# Altium integrated library Integrated_jp.IntLib: 316 symbols (part 1 of 3) (continued)
## Cap_polar 1000uF/16v (continued)
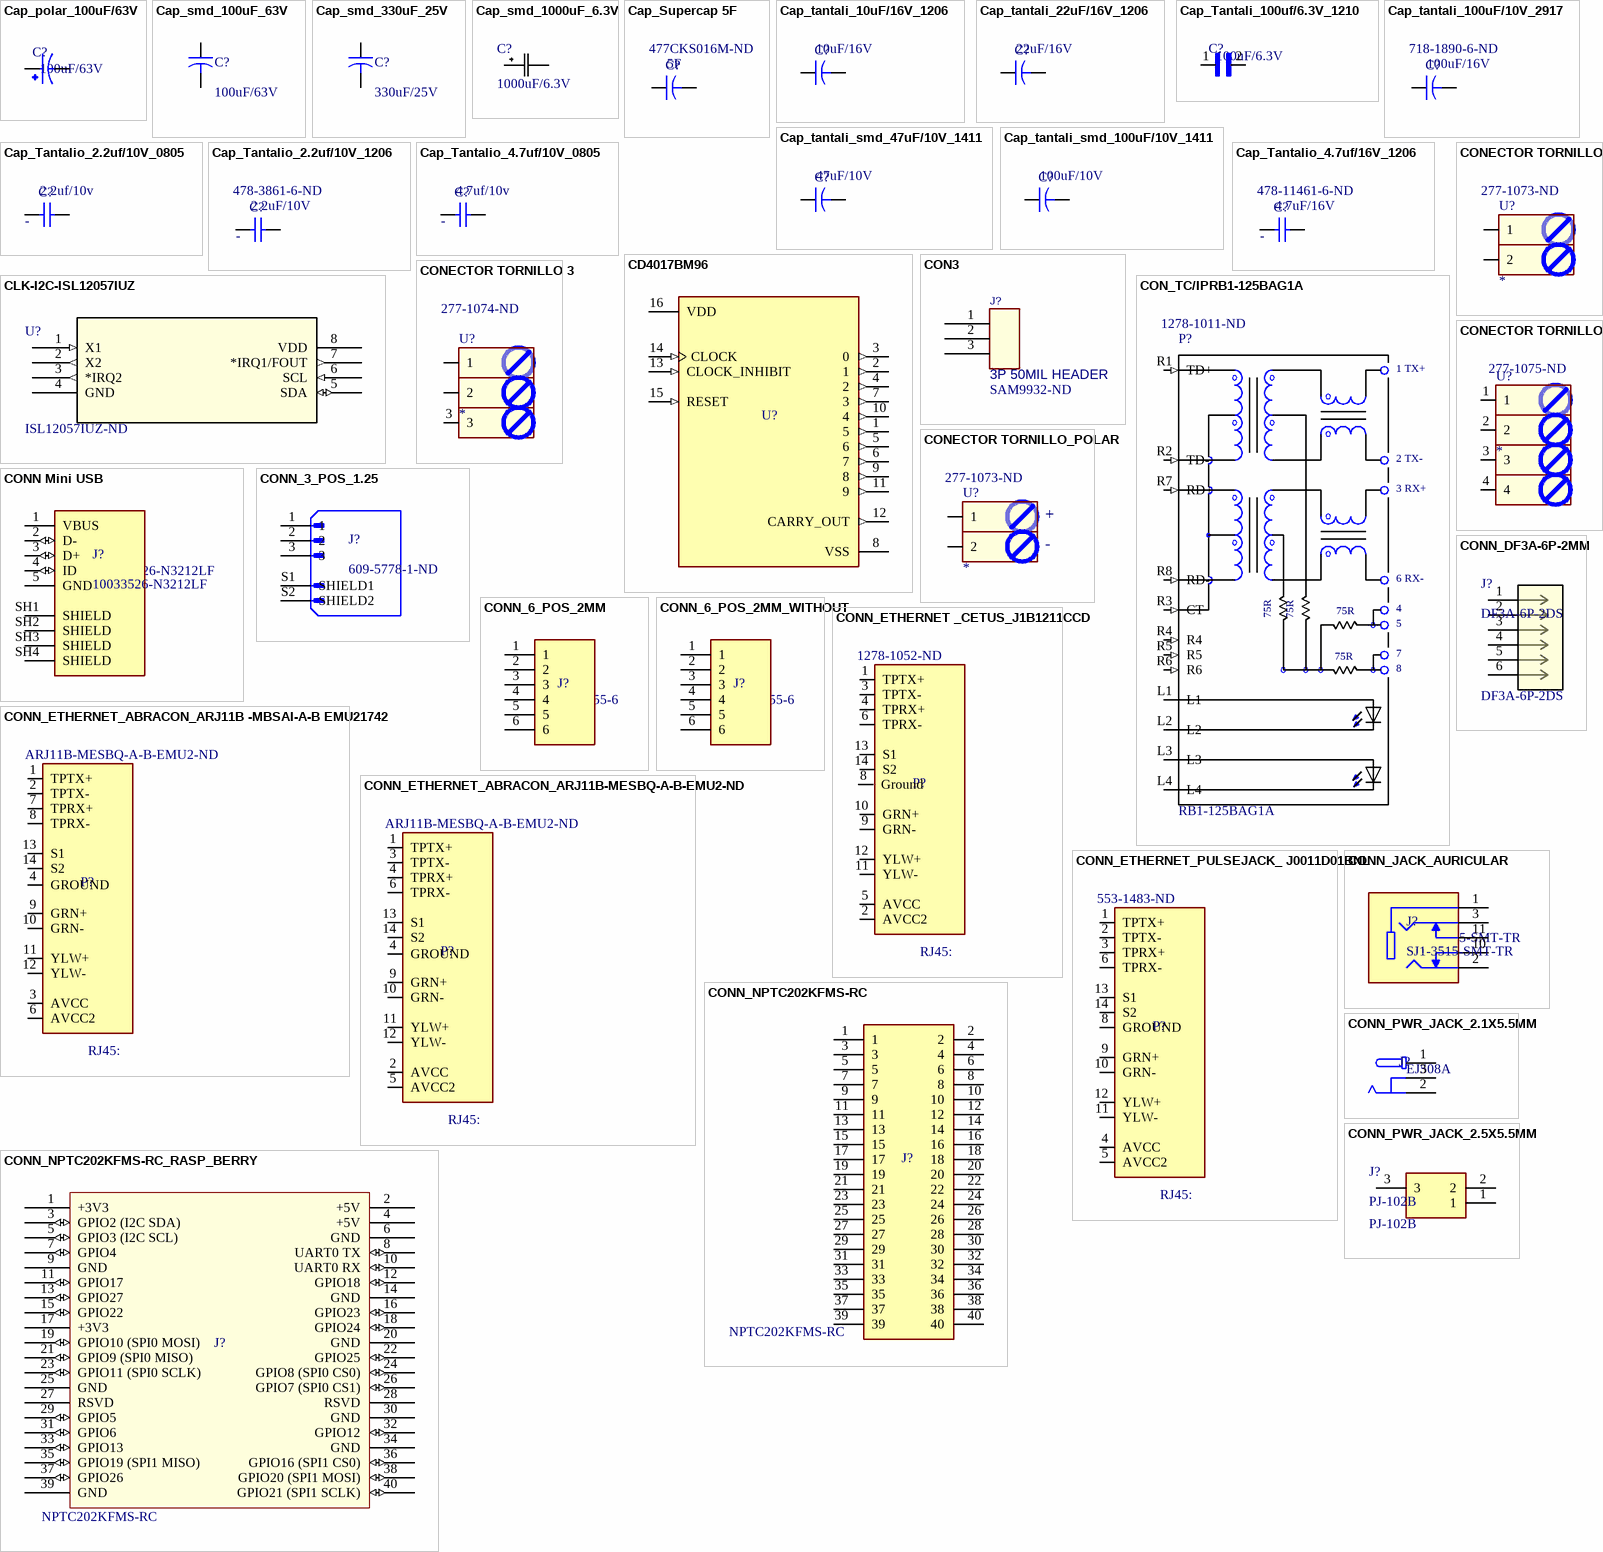
[diagram p1: symbols Cap_polar_100uF/63V to CONN_PWR_JACK_2.5X5.5MM]

## Cap_polar_100uF/63V
designator C?, comment value 100uF/63V  (hidden comment: EEU-FC1J101)
Capacitores electrolíticos de aluminio 100 µF 63 V Radial, encapsulado 3000 h a 105°C; Digi_Key_Part_Number: P10343-ND; Price: 0,65; ComponentLink1Description: CAP ALUM 100UF 20% 63V RADIAL TH; ComponentLink1URL: https://www.digikey.com/es/products/detail/panasonic-electronic-components/EEU-FC1J101/266352; Link: https://www.digikey.com/es/products/detail/panasonic-electronic-components/EEU-FC1J101/266352; LCSC Part: C2772; Mouser Part: 667-EEU-FC1J101; Price JLCPCB: 0,05
footprint CAPPRD500W60D1000H1250
pins: N, P

## Cap_smd_100uF_63V
designator C?, comment value 100uF/63V  (hidden comment: A782MS107M1JLAS030)
100 µF 63 V Aluminum - Polymer Capacitors Radial, Can - SMD 30mOhm 4000 Hrs @ 135°C; Digi_Key_Part_Number: 399-A782MS107M1JLAS030CT-ND; Link: https://www.digikey.com/en/products/detail/kemet/A782MS107M1JLAS030/21544807; Price: 1,07; JLCPCB Part: C6486600; ComponentLink1Description: CAP ALUMHYB 100UF 20% 63V SMD; ComponentLink1URL: https://www.digikey.com/en/products/detail/kemet/A782MS107M1JLAS030/21544807
footprint CAPAE1030X1030N
pins: 1, 2

## Cap_smd_330uF_25V
designator C?, comment value 330uF/25V  (hidden comment: PCE4931CT-ND)
330 µF 25 V Aluminum Electrolytic Capacitors Radial, Can - SMD 3000 Hrs @ 125°C; ComponentLink1Description: EEE-TP1E331AP; ComponentLink1URL: https://www.digikey.com/en/products/detail/panasonic-electronic-components/EEE-TP1E331AP/1975655; Digi_Key_Part_Number: PCE4931CT-ND; Link: https://www.digikey.com/en/products/detail/panasonic-electronic-components/EEE-TP1E331AP/1975655; Price: 1,57; JLCPCB Part: C2162880
footprint CAPAE1030X1030N
pins: 1, 2

## Cap_smd_1000uF_6.3V
designator C?, comment value 1000uF/6.3V  (hidden comment: RHS0J102MCN1GS)
1000 µF 6.3 V Aluminum - Polymer Capacitors Radial, Can - SMD 10mOhm 2000 Hrs @ 105°C; Digi_Key_Part_Number: 493-3774-1-ND; ComponentLink1Description: CAP ALUM POLY 1000UF 20% 6.3V; ComponentLink1URL: https://www.digikey.com/en/products/detail/nichicon/RHS0J102MCN1GS/2209464; Link: https://www.digikey.com/en/products/detail/nichicon/RHS0J102MCN1GS/2209464; Price: 1,28; JLCPCB Part: C3275499
footprint CAP_RHAHS_8X11P7_NCH
pins: 1, 2

## Cap_Supercap 5F
designator C?, comment value 5F  Supplier Part Number 1: 477CKS016M-ND  (hidden comment: 478-SCCR25B505PRB-ND)
5 F (EDLC) Supercapacitor 2.7 V Radial, Can 85mOhm @ 1kHz 2000 Hrs @ 65°C; Manufacturer: KYOCERA AVX; Dielectric Material: Aluminium; Capacitance: 5 F; Tolerance: 20%; Voltage Rating (DC): 2.7V; Life (Hours): 2000Hour; Ripple Current: 960mA; Leakage Current: 750uA; Dissipation Factor: 0.16%; Lead Diameter: 0.6mm; Published: 23-Sep-2002; PackageReference: CAPR5-4X5; Publisher: Altium Limited; PackageDescription: Capacitor; 2 Leads; Manufacturer Part Number: SCCR25B505PRB; Mount: Through Hole,PCB; Case/Package: Radial; Number of Pins: 2; Min Operating Temperature: -40°C; Max Operating Temperature: 85°C; Packaging: Tape and Reel; Voltage Rating: 2.7V; Package Quantity: 500; Termination: Radial; Voltage: 2.7V; Diameter: 10mm; Length: 20mm; Height: 20mm; Lead Pitch: 5mm; Height - Seated (Max): 0.866inch; Radiation Hardening: No; REACH SVHC: No SVHC; Lead Free: Lead Free; Supplier 1: Digi-Key; ComponentLink1Description: SUPERCAP CYLINDRICAL; ComponentLink1URL: https://www.digikey.com/en/products/detail/kyocera-avx/SCCR25B505PRB/12663768; Digi_Key_Part_Number: 478-SCCR25B505PRB-ND; Link: https://www.digikey.com/en/products/detail/kyocera-avx/SCCR25B505PRB/12663768; Price: 1,42
footprint C470U
pins: 1, 2

## Cap_tantali_10uF/16V_1206
designator C?, comment value 10uF/16V  (hidden comment: 718-1956-1-ND)
10 µF Molded Tantalum Capacitors 16 V 1206 (3216 Metric) 3Ohm; ComponentLink1Description: 293D106X0016A2TE3; ComponentLink1URL: https://www.digikey.com/es/products/detail/vishay-sprague/293D106X0016A2TE3/1578608; Digi_Key_Part_Number: 718-1956-1-ND; Link: https://www.digikey.com/es/products/detail/vishay-sprague/293D106X0016A2TE3/1578608; Price: 0,36; LCSC Part: C2162859; Mouser Part: 74-293D106X0016A2TE3; Price JLCPCB: 0,16
footprint CAP-A Size (Tantal CAP A Size EIA/IECQ 3216)
pins: 1 +, 2

## Cap_tantali_22uF/16V_1206
designator C?, comment value 22uF/16V  (hidden comment: TAJA226M016RNJ)
Capacitores de tantalio Moldeado 22 µF 16 V 1206 (3216 métrico) 2.3Ohm a 100kHz; Digi_Key_Part_Number: 478-13513-1-ND; Link: https://www.digikey.com/es/products/detail/kyocera-avx/TAJA226M016RNJ/10381501; ComponentLink1Description: CAP TANT 22UF 20% 16V 1206; ComponentLink1URL: https://www.digikey.com/es/products/detail/kyocera-avx/TAJA226M016RNJ/10381501; Price: 0,63; LCSC Part: C6328904; Mouser Part: *; Price JLCPCB: 0,34
footprint CAP-A Size (Tantal CAP A Size EIA/IECQ 3216)
pins: 1 +, 2

## Cap_Tantali_100uf/6.3V_1210
designator C?, comment value 100uF/6.3V  (hidden comment: TAJB107M006RNJ)
100 µF Molded Tantalum Capacitors 6.3 V 1411 (3528 Metric), 1210 1.7Ohm; Digi_Key_Part_Number: 478-3877-1-ND; Link: https://www.digikey.com/en/products/detail/kyocera-avx/TAJB107M006RNJ/1126805; Price: 0,56; ComponentLink1Description: CAP TANT 100UF 20% 6.3V 1411; ComponentLink1URL: https://www.digikey.com/en/products/detail/kyocera-avx/TAJB107M006RNJ/1126805
footprint CAPPC3528X210N
pins: 1 +, 2 -

## Cap_tantali_100uF/10V_2917
designator C?, comment value 100uF/16V  Supplier Part Number 1: 718-1890-6-ND  (hidden comment: 718-1890-1-ND)
Capacitores de tantalio Moldeado 100 µF 10 V 2917 (7343 métrico) 600mOhm; Manufacturer: Nichicon; Manufacturer Part Number: UVR1E102MPD1TD; Dielectric Material: Aluminium; Capacitance: 1mF; Tolerance: 20%; Voltage Rating (DC): 25V; Life (Hours): 2000Hour; Ripple Current: 960mA; Leakage Current: 750uA; Dissipation Factor: 0.16%; Lead Diameter: 0.6mm; Published: 23-Sep-2002; PackageReference: CAPR5-4X5; Publisher: Altium Limited; PackageDescription: Capacitor; 2 Leads; Mount: Through Hole,PCB; Case/Package: Radial; Number of Pins: 2; Min Operating Temperature: -40°C; Max Operating Temperature: 85°C; Packaging: Tape and Reel; Voltage Rating: 25V; Package Quantity: 500; Termination: Radial; Voltage: 25V; Diameter: 10mm; Length: 20mm; Height: 20mm; Lead Pitch: 5mm; Height - Seated (Max): 0.866inch; Radiation Hardening: No; REACH SVHC: No SVHC; Lead Free: Lead Free; Supplier 1: Digi-Key; Digi_Key_Part_Number: 718-1890-1-ND; Link: https://www.digikey.com/es/products/detail/293D107X5010D2TE3/718-1890-6-ND/3542941?utm_campaign=buynow&utm_medium=aggregator&curr=usd&utm_source=octopart; ComponentLink1Description: CAP TANT 100UF 5% 10V 2917; ComponentLink1URL: https://www.digikey.com/es/products/detail/293D107X5010D2TE3/718-1890-6-ND/3542941?utm_campaign=buynow&utm_medium=aggregator&curr=usd&utm_source=octopart; Price: 1,39
footprint CAP_2917
pins: 1 +, 2

## Cap_tantali_smd_47uF/10V_1411
designator C?, comment value 47uF/10V  (hidden comment: 399-9728-1-ND)
47 µF Molded Tantalum Capacitors 10 V 1411 (3528 Metric) 1Ohm; ComponentLink1Description: T491B476K010AT; ComponentLink1URL: https://www.digikey.com/es/products/detail/kemet/T491B476K010AT/3724805?s=N4IgTCBcDaIMwE4EFoEHYwA5kEZkDkAREAXQF8g; Link: https://www.digikey.com/es/products/detail/kemet/T491B476K010AT/3724805?s=N4IgTCBcDaIMwE4EFoEHYwA5kEZkDkAREAXQF8g; Price: 0,63; Digi_Key_Part_Number: 399-9728-1-ND; LCSC Part: C116617; Mouser Part: 80-T491B476K010; Price JLCPCB: 0,16
footprint CAPPC3528X210N
pins: 1, 2

## Cap_tantali_smd_100uF/10V_1411
designator C?, comment value 100uF/10V  (hidden comment: F931A107KBA)
Capacitores de tantalio Moldeado 100 µF 10 V 1411 (3528 métrico), 1210 1.2Ohm a 100kHz; Digi_Key_Part_Number: 478-8195-1-ND; Link: https://www.digikey.com/es/products/detail/kyocera-avx/F931A107KBA/4005266; Price: 0,77; LCSC Part: C7196; Mouser Part: 647-F931A107KBA; Price JLCPCB: 0,24; ComponentLink1Description: CAP TANT 100UF 10% 10V 1411; ComponentLink1URL: https://www.digikey.com/es/products/detail/kyocera-avx/F931A107KBA/4005266
footprint CAPPC3528X210N
pins: 1, 2

## Cap_Tantalio_2.2uf/10V_0805
designator C?, comment value 2.2uf/10v  (hidden comment: 718-2352-1-ND)
Capacitores de tantalCapacitores de tantalio Moldeado 2.2 µF 10 V 0805 (2012 métrico) 8.8Ohm a 100kHzio Moldeado 10µF 16V 0805; ComponentLink1Description: CAP TANT 2.2UF 20% 10V 0805; ComponentLink1URL: https://www.digikey.com/es/products/detail/TMCHP1A225MTRF/718-2352-6-ND/10107774?utm_campaign=buynow&utm_medium=aggregator&curr=usd&utm_source=octopart; Digi_Key_Part_Number: 718-2352-1-ND; Link: https://www.digikey.com/es/products/detail/TMCHP1A225MTRF/718-2352-6-ND/10107774?utm_campaign=buynow&utm_medium=aggregator&curr=usd&utm_source=octopart; Price: 0,26; LCSC Part: C5137599; Mouser Part: TMCHP1A225MTRF; Price JLCPCB: 0,02
footprint CAP_tantalio_0805
pins: 1 -, 2

## Cap_Tantalio_2.2uf/10V_1206
designator C?, comment value 2.2uF/10V  Supplier Part Number 1: 478-3861-6-ND  (hidden comment: 478-3861-1-ND)
2.2 µF Molded Tantalum Capacitors 10 V 1206 (3216 Metric) 7Ohm @ 100kHz; Manufacturer: Kyocera AVX; Manufacturer Part Number: 08055C104MAT2A; Dielectric Material: Ceramic; Capacitance: 100nF; Voltage Rating: 50V; Tolerance: 20%; Dielectric: X7R; Dissipation Factor: 2.5%; Insulation Resistance: 100GR; ESR (Equivalent Series Resistance): 3R; Life (Hours): 2000Hour; Published: 8-Jun-2000; LatestRevisionDate: 17-Jul-2002; LatestRevisionNote: Re-released for DXP Platform.; PackageReference: RAD-0.3; Publisher: Altium Limited; PackageDescription: Radial Cap, Thru-Hole; 2 Leads; 0.3 in Pin Spacing; Mount: Surface Mount,PCB; Case/Package: 0805; Number of Pins: 2; Case Code (Metric): 2012; Case Code (Imperial): 0805; Contact Plating: Tin,Matte; Min Operating Temperature: -55°C; Max Operating Temperature: 125°C; Package Quantity: 1; Packaging: Tape and Reel; Voltage Rating (DC): 50V; Termination: SMD/SMT; Voltage: 50V; Length: 2.01mm; Height: 0.94mm; Width: 0.049inch; Thickness: 0.037inch; Depth: 1.25mm; Radiation Hardening: No; REACH SVHC: No SVHC; Lead Free: Lead Free; Features: General Purpose; Supplier 1: Digi-Key; Link: https://www.digikey.com/es/products/detail/TAJA225K010RNJ/478-3861-6-ND/1127025?utm_campaign=buynow&utm_medium=aggregator&curr=usd&utm_source=octopart; Digi_Key_Part_Number: 478-3861-1-ND; ComponentLink1Description: CAP TANT 2.2UF 10% 10V 1206; ComponentLink1URL: https://www.digikey.com/es/products/detail/kyocera-avx/TAJA225K010RNJ/1126789?s=N4IgTCBcDaICwHYAcBaAzEgbARhbgcgCIgC6AvkA; Price: 0,38
footprint CAP_tantalio_1206
pins: 1 -, 2

## Cap_Tantalio_4.7uf/10V_0805
designator C?, comment value 4.7uf/10v  (hidden comment: F921A475MPA)
Capacitores de tantalio Moldeado 4.7 µF 10 V 0805 (2012 métrico) 6Ohm; Digi_Key_Part_Number: 478-8125-1-ND; Link: https://www.digikey.com/es/products/detail/kyocera-avx/F921A475MPA/4004984; Price: 0,36; LCSC Part: C76639; Price JLCPCB: 0,039; ComponentLink1Description: CAP TANT 4.7UF 20% 10V 0805; ComponentLink1URL: https://www.digikey.com/es/products/detail/kyocera-avx/F921A475MPA/4004984
footprint CAP_tantalio_0805
pins: 1 -, 2

## Cap_Tantalio_4.7uf/16V_1206
designator C?, comment value 4.7uF/16V  Supplier Part Number 1: 478-11461-6-ND  (hidden comment: 478-11461-1-ND)
Capacitores de tantalio Moldeado 4.7 µF 16 V 1206 (3216 métrico); Manufacturer: Kyocera AVX; Manufacturer Part Number: 08055C104MAT2A; Dielectric Material: Ceramic; Capacitance: 100nF; Voltage Rating: 50V; Tolerance: 20%; Dielectric: X7R; Dissipation Factor: 2.5%; Insulation Resistance: 100GR; ESR (Equivalent Series Resistance): 3R; Life (Hours): 2000Hour; Published: 8-Jun-2000; LatestRevisionDate: 17-Jul-2002; LatestRevisionNote: Re-released for DXP Platform.; PackageReference: RAD-0.3; Publisher: Altium Limited; PackageDescription: Radial Cap, Thru-Hole; 2 Leads; 0.3 in Pin Spacing; Mount: Surface Mount,PCB; Case/Package: 0805; Number of Pins: 2; Case Code (Metric): 2012; Case Code (Imperial): 0805; Contact Plating: Tin,Matte; Min Operating Temperature: -55°C; Max Operating Temperature: 125°C; Package Quantity: 1; Packaging: Tape and Reel; Voltage Rating (DC): 50V; Termination: SMD/SMT; Voltage: 50V; Length: 2.01mm; Height: 0.94mm; Width: 0.049inch; Thickness: 0.037inch; Depth: 1.25mm; Radiation Hardening: No; REACH SVHC: No SVHC; Lead Free: Lead Free; Features: General Purpose; Supplier 1: Digi-Key; Digi_Key_Part_Number: 478-11461-1-ND; Link: https://www.digikey.com/es/products/detail/TAJA475K016UNJ/478-11461-6-ND/8019359?utm_campaign=buynow&utm_medium=aggregator&curr=usd&utm_source=octopart; ComponentLink1Description: CAP TANT 4.7UF 10% 16V 1206; ComponentLink1URL: https://www.digikey.com/es/products/detail/TAJA475K016UNJ/478-11461-6-ND/8019359?utm_campaign=buynow&utm_medium=aggregator&curr=usd&utm_source=octopart; Price: 0,38
footprint CAP_tantalio_1206
pins: 1 -, 2

## CD4017BM96
designator U?
Counter IC Counter, Decade 1 Element 10 Bit Positive, Negative 16-SOIC; Digi_Key_Part_Number: 296-25940-1-ND; Price: 0,47; ComponentLink1Description: CD4017BM96; ComponentLink1URL: https://www.digikey.com/en/products/detail/texas-instruments/CD4017BM96/1690809; Link: https://www.digikey.com/en/products/detail/texas-instruments/CD4017BM96/1690809; Price JLCPCB: 0,41; LCSC Part: C11349; Mouser Part: *; Value: CD4017BM96
footprint SOIC127P600X175-16N
pins: 1 5 (out), 2 1 (out), 3 0 (out), 4 2 (out), 5 6 (out), 6 7 (out), 7 3 (out), 8 VSS (power), 9 8 (out), 10 4 (out), 11 9 (out), 12 CARRY_OUT (out), 13 CLOCK_INHIBIT (in), 14 CLOCK (in), 15 RESET (in), 16 VDD (power)

## CLK-I2C-ISL12057IUZ
designator U?, comment value ISL12057IUZ-ND  (hidden comment: ISL12057IUZ)
Relojes de tiempo real (RTC) IC Reloj/calendario I2C, 2-Wire serial 8-TSSOP, 8-MSOP (0.118", 3.00mm de ancho); Mfr_Name: Renesas / Intersil; RefDes: RefDes; Type: Type; ComponentLink1Description: IC RTC CLK/CALENDAR I2C 8MSOP; ComponentLink1URL: https://www.digikey.com/es/products/detail/renesas-electronics-corporation/ISL12057IUZ/2096552; Link: https://www.digikey.com/es/products/detail/renesas-electronics-corporation/ISL12057IUZ/2096552; Digi_Key_Part_Number: ISL12057IUZ-ND; Price: 2,78
footprint 8L-MSOP_REN
pins: 1 X1 (in), 2 X2 (out), 3 *IRQ2 (out), 4 GND (power), 5 SDA (io), 6 SCL (in), 7 *IRQ1/FOUT (out), 8 VDD (power)

## CON3
designator J?, comment 3P 50MIL HEADER  Supplier Part Number 1: SAM9932-ND
COMPSIDE: TOP; COMPLOC: [730.000,710.000]; COMPROT: 0; COMPFIXED: NO; COMPHEIGHT: 0.000; COMPGROUP: 0; COMPLOCKED: NO; COMPKEY: NO; DECOUPLER: NO; MEMORY: NO; Supplier 1: Digi-Key
footprint 3P 50 MIL HEADER_RDS
pins: 1, 2, 3

## CON_TC/IPRB1-125BAG1A
designator P?, comment RB1-125BAG1A  Supplier Part Number 1: 1278-1011-ND
Accessory RJ-45 With Transformer Connector - UDE; MF: WIZnet; Shielding: Shielded; Connector Type: RJ45; Number of Ports: 1; Direction: Down; Number of Positions: 8; Insulation Resistance: 500MR; Number of Cores per Jack: 4; Availability: Unavailable; Price: None; Package: HVQFN-36 NXP Semiconductors; SnapEDA_Link: https://www.snapeda.com/parts/RB1-125BAG1A/WIZnet/view-part/?ref=snap; MP: RB1-125BAG1A; Value: *; Supplier 1: Digi-Key; Manufacturer: WIZnet; Manufacturer Part Number: RB1-125BAG1A; Stock 1: 11611; Pricing 1: 1=2.55, 10=2.448, 25=2.244, 50=2.142, 100=2.04, 250=1.785, 500=1.734, 1000=1.56 (USD); Mount: Through Hole; Case/Package: 100; Color: Green,Yellow,Black; Contact Material: Bronze; Contact Plating: Gold; Housing Material: Thermoplastic; Min Operating Temperature: 0°C; Max Operating Temperature: 70°C; Number of Rows: 1; Packaging: Bulk; Package Quantity: 420; Termination: Solder; Lead Free: Lead Free; ComponentLink1URL: http://www1.futureelectronics.com/doc/WIZNET%20INC/RB1-125BAG1A.pdf?src-supplier=Future+Electronics; ComponentLink1Description: http://www1.futureelectronics.com/doc/WIZNET%20INC/RB1-125BAG1A.pdf?src-supplier=Future+Electronics; ComponentLink2URL: http://www.jameco.com/Jameco/Products/ProdDS/2132875.pdf?src-supplier=Jameco; ComponentLink2Description: http://www.jameco.com/Jameco/Products/ProdDS/2132875.pdf?src-supplier=Jameco; ComponentLink3URL: https://www.shopwiznet.com/lanotattachments/download/file/id/95/store/1/?src-supplier=Digi-Key; ComponentLink3Description: https://www.shopwiznet.com/lanotattachments/download/file/id/95/store/1/?src-supplier=Digi-Key; ComponentLink4URL: http://www.mouser.com/ds/2/443/RB1-125BAG1A(111-00)-224696.pdf?src-supplier=Mouser; ComponentLink4Description: http://www.mouser.com/ds/2/443/RB1-125BAG1A(111-00)-224696.pdf?src-supplier=Mouser
footprint J1B1211CCD
pins: L1, L2, L3, L4, R1 TD+ (in), R2 TD- (in), R3 CT (in), R4 (in), R5 (in), R6 (in), R7 RD+ (in), R8 RD- (in)
text: 1 TX+; 2 TX-; 3 RX+; 6 RX-; 75R; 5; 7

## CONECTOR TORNILLO 2
designator U?  Supplier Part Number 1: 277-1073-ND
Manufacturer: Phoenix Contact; Manufacturer Part Number: 1753437; Current Rating: 12A; Voltage Rating: 250V; Number of Positions: 2; Number of Levels: 1; Voltage: 300V; Voltage Rating (DC): 400V; Pitch: 5mm; Approvals: UL,CSA; Supplier 1: Digi-Key; Stock 1: 7580; Pricing 1: 1=0.72, 10=0.688, 50=0.6584, 100=0.6404, 250=0.59852, 500=0.55062, 1000=0.50873, 2500=0.48479, 5000=0.45486 (USD); Mount: Through Hole; Weight: 0.037778oz; Color: Grey,Green; Contact Plating: Tin; Contact Material: Copper,Tin; Housing Color: Green; Housing Material: Polybutylene; Number of Rows: 1; Package Quantity: 50; Packaging: Bulk; Termination: Solder; Number of Positions Per Level: 2; Current: 12A; Max Current Rating: 12A; Number of Contacts: 2; Orientation: Straight; Number of Poles: 2; Length: 10mm; Height: 10mm; Width: 15.9mm; Depth: 8.6mm; Lead Free: Lead Free; Flammability Rating: UL94 V-0; ComponentLink1URL: https://www.verical.com/server-webapp/html/getDatasheet?partID=294641&src-supplier=Verical; ComponentLink1Description: https://www.verical.com/server-webapp/html/getDatasheet?partID=294641&src-supplier=Verical; ComponentLink2URL: https://media.digikey.com/pdf/Data%20Sheets/Phoenix%20Contact%20PDFs/1753437.pdf?src-supplier=Digi-Key; ComponentLink2Description: https://media.digikey.com/pdf/Data%20Sheets/Phoenix%20Contact%20PDFs/1753437.pdf?src-supplier=Digi-Key; ComponentLink3URL: https://produktinfo.conrad.com/datenblaetter/725000-749999/743815-da-01-en-GRUNDGEHAEUSE__MSTBV_2_5__2_G.pdf?src-supplier=Conrad; ComponentLink3Description: https://produktinfo.conrad.com/datenblaetter/725000-749999/743815-da-01-en-GRUNDGEHAEUSE__MSTBV_2_5__2_G.pdf?src-supplier=Conrad
footprint 277-1140 (TERM BLOCK 2POS)
pins: 1, 2

## CONECTOR TORNILLO 3
designator U?  Supplier Part Number 1: 277-1074-ND
Manufacturer: Phoenix Contact; Manufacturer Part Number: 1753437; Current Rating: 12A; Voltage Rating: 250V; Number of Positions: 2; Number of Levels: 1; Voltage: 300V; Voltage Rating (DC): 400V; Pitch: 5mm; Approvals: UL,CSA; Mount: Through Hole; Weight: 0.037778oz; Color: Grey,Green; Contact Plating: Tin; Contact Material: Copper,Tin; Housing Color: Green; Housing Material: Polybutylene; Number of Rows: 1; Package Quantity: 50; Packaging: Bulk; Termination: Solder; Number of Positions Per Level: 2; Current: 12A; Max Current Rating: 12A; Number of Contacts: 2; Orientation: Straight; Number of Poles: 2; Length: 10mm; Height: 10mm; Width: 15.9mm; Depth: 8.6mm; Lead Free: Lead Free; Flammability Rating: UL94 V-0; ComponentLink1URL: https://www.verical.com/server-webapp/html/getDatasheet?partID=294641&src-supplier=Verical; ComponentLink1Description: https://www.verical.com/server-webapp/html/getDatasheet?partID=294641&src-supplier=Verical; ComponentLink2URL: https://media.digikey.com/pdf/Data%20Sheets/Phoenix%20Contact%20PDFs/1753437.pdf?src-supplier=Digi-Key; ComponentLink2Description: https://media.digikey.com/pdf/Data%20Sheets/Phoenix%20Contact%20PDFs/1753437.pdf?src-supplier=Digi-Key; ComponentLink3URL: https://produktinfo.conrad.com/datenblaetter/725000-749999/743815-da-01-en-GRUNDGEHAEUSE__MSTBV_2_5__2_G.pdf?src-supplier=Conrad; ComponentLink3Description: https://produktinfo.conrad.com/datenblaetter/725000-749999/743815-da-01-en-GRUNDGEHAEUSE__MSTBV_2_5__2_G.pdf?src-supplier=Conrad; Supplier 1: Digi-Key; Stock 1: 2384; Pricing 1: 1=1.06, 10=1.014, 50=0.9702, 100=0.9437, 250=0.882, 500=0.81144, 1000=0.7497, 2500=0.71442, 5000=0.67032 (USD); ComponentLink4URL: https://media.digikey.com/pdf/Data%20Sheets/Phoenix%20Contact%20PDFs/1753453.pdf?src-supplier=Digi-Key; ComponentLink4Description: https://media.digikey.com/pdf/Data%20Sheets/Phoenix%20Contact%20PDFs/1753453.pdf?src-supplier=Digi-Key; ComponentLink5URL: https://www.alliedelec.com/m/d/04bf1952d21caef77442e0e02da47893.pdf?src-supplier=Allied+Electronics; ComponentLink5Description: https://www.alliedelec.com/m/d/04bf1952d21caef77442e0e02da47893.pdf?src-supplier=Allied+Electronics; ComponentLink6URL: https://produktinfo.conrad.com/datenblaetter/725000-749999/743827-da-01-en-GRUNDGEHAEUSE__MSTBV_2_5__3_G.pdf?src-supplier=Conrad; ComponentLink6Description: https://produktinfo.conrad.com/datenblaetter/725000-749999/743827-da-01-en-GRUNDGEHAEUSE__MSTBV_2_5__3_G.pdf?src-supplier=Conrad
footprint 277-1141 (TERM BLOCK HDR 3POS)
pins: 1, 2, 3

## CONECTOR TORNILLO 4
designator U?  Supplier Part Number 1: 277-1075-ND
Manufacturer: Phoenix Contact; Manufacturer Part Number: 1753437; Current Rating: 12A; Voltage Rating: 250V; Number of Positions: 2; Number of Levels: 1; Voltage: 300V; Voltage Rating (DC): 400V; Pitch: 5mm; Approvals: UL,CSA; Mount: Through Hole; Weight: 0.037778oz; Color: Grey,Green; Contact Plating: Tin; Contact Material: Copper,Tin; Housing Color: Green; Housing Material: Polybutylene; Number of Rows: 1; Package Quantity: 50; Packaging: Bulk; Termination: Solder; Number of Positions Per Level: 2; Current: 12A; Max Current Rating: 12A; Number of Contacts: 2; Orientation: Straight; Number of Poles: 2; Length: 10mm; Height: 10mm; Width: 15.9mm; Depth: 8.6mm; Lead Free: Lead Free; Flammability Rating: UL94 V-0; ComponentLink1URL: https://www.verical.com/server-webapp/html/getDatasheet?partID=294641&src-supplier=Verical; ComponentLink1Description: https://www.verical.com/server-webapp/html/getDatasheet?partID=294641&src-supplier=Verical; ComponentLink2URL: https://media.digikey.com/pdf/Data%20Sheets/Phoenix%20Contact%20PDFs/1753437.pdf?src-supplier=Digi-Key; ComponentLink2Description: https://media.digikey.com/pdf/Data%20Sheets/Phoenix%20Contact%20PDFs/1753437.pdf?src-supplier=Digi-Key; ComponentLink3URL: https://produktinfo.conrad.com/datenblaetter/725000-749999/743815-da-01-en-GRUNDGEHAEUSE__MSTBV_2_5__2_G.pdf?src-supplier=Conrad; ComponentLink3Description: https://produktinfo.conrad.com/datenblaetter/725000-749999/743815-da-01-en-GRUNDGEHAEUSE__MSTBV_2_5__2_G.pdf?src-supplier=Conrad; ComponentLink4URL: https://www.verical.com/server-webapp/html/getDatasheet?partID=247903&src-supplier=Verical; ComponentLink4Description: https://www.verical.com/server-webapp/html/getDatasheet?partID=247903&src-supplier=Verical; ComponentLink5URL: https://media.digikey.com/pdf/Data%20Sheets/Phoenix%20Contact%20PDFs/1754478.pdf?src-supplier=Digi-Key; ComponentLink5Description: https://media.digikey.com/pdf/Data%20Sheets/Phoenix%20Contact%20PDFs/1754478.pdf?src-supplier=Digi-Key; ComponentLink6URL: https://produktinfo.conrad.com/datenblaetter/725000-749999/743854-da-01-en-GRUNDGEHAEUSE__MSTB_2_5__4_G.pdf?src-supplier=Conrad; ComponentLink6Description: https://produktinfo.conrad.com/datenblaetter/725000-749999/743854-da-01-en-GRUNDGEHAEUSE__MSTB_2_5__4_G.pdf?src-supplier=Conrad; Supplier 1: Digi-Key; Stock 1: 3061; Pricing 1: 1=1.45, 10=1.389, 50=1.3282, 100=1.292, 250=1.20752, 500=1.1109, 1000=1.02637, 2500=0.97807, 5000=0.9177 (USD); ComponentLink7URL: https://media.digikey.com/pdf/Data%20Sheets/Phoenix%20Contact%20PDFs/1753479.pdf?src-supplier=Digi-Key; ComponentLink7Description: https://media.digikey.com/pdf/Data%20Sheets/Phoenix%20Contact%20PDFs/1753479.pdf?src-supplier=Digi-Key; ComponentLink8URL: https://www.verical.com/server-webapp/html/getDatasheet?partID=717945&src-supplier=Verical; ComponentLink8Description: https://www.verical.com/server-webapp/html/getDatasheet?partID=717945&src-supplier=Verical; ComponentLink9URL: https://produktinfo.conrad.com/datenblaetter/725000-749999/743463-da-01-en-GRUNDGEHAEUSE___MSTBV_2_5__4_G.pdf?src-supplier=Conrad; ComponentLink9Description: https://produktinfo.conrad.com/datenblaetter/725000-749999/743463-da-01-en-GRUNDGEHAEUSE___MSTBV_2_5__4_G.pdf?src-supplier=Conrad
footprint 277-1075 (TERM BLOCK HDR 3POS)
pins: 1, 2, 3, 4

## CONECTOR TORNILLO_POLAR
designator U?  Supplier Part Number 1: 277-1073-ND
Manufacturer: Phoenix Contact; Manufacturer Part Number: 1753437; Current Rating: 12A; Voltage Rating: 250V; Number of Positions: 2; Number of Levels: 1; Voltage: 300V; Voltage Rating (DC): 400V; Pitch: 5mm; Approvals: UL,CSA; Supplier 1: Digi-Key; Stock 1: 7580; Pricing 1: 1=0.72, 10=0.688, 50=0.6584, 100=0.6404, 250=0.59852, 500=0.55062, 1000=0.50873, 2500=0.48479, 5000=0.45486 (USD); Mount: Through Hole; Weight: 0.037778oz; Color: Grey,Green; Contact Plating: Tin; Contact Material: Copper,Tin; Housing Color: Green; Housing Material: Polybutylene; Number of Rows: 1; Package Quantity: 50; Packaging: Bulk; Termination: Solder; Number of Positions Per Level: 2; Current: 12A; Max Current Rating: 12A; Number of Contacts: 2; Orientation: Straight; Number of Poles: 2; Length: 10mm; Height: 10mm; Width: 15.9mm; Depth: 8.6mm; Lead Free: Lead Free; Flammability Rating: UL94 V-0; ComponentLink1URL: https://www.verical.com/server-webapp/html/getDatasheet?partID=294641&src-supplier=Verical; ComponentLink1Description: https://www.verical.com/server-webapp/html/getDatasheet?partID=294641&src-supplier=Verical; ComponentLink2URL: https://media.digikey.com/pdf/Data%20Sheets/Phoenix%20Contact%20PDFs/1753437.pdf?src-supplier=Digi-Key; ComponentLink2Description: https://media.digikey.com/pdf/Data%20Sheets/Phoenix%20Contact%20PDFs/1753437.pdf?src-supplier=Digi-Key; ComponentLink3URL: https://produktinfo.conrad.com/datenblaetter/725000-749999/743815-da-01-en-GRUNDGEHAEUSE__MSTBV_2_5__2_G.pdf?src-supplier=Conrad; ComponentLink3Description: https://produktinfo.conrad.com/datenblaetter/725000-749999/743815-da-01-en-GRUNDGEHAEUSE__MSTBV_2_5__2_G.pdf?src-supplier=Conrad
footprint 277-1140 (TERM BLOCK 2POS)
pins: 1, 2
text: +; -

## CONN Mini USB
designator J?, comment 10033526-N3212LF
MINI USB 2.0- B Type Receptacle conn. Right Angle Surface Mount Type; Digi_Key_Part_Number: 609-4700-1-ND; SnapEDA_Link: https://www.snapeda.com/parts/10033526-N3212LF/Amphenol+FCI/view-part/?ref=snap; Price: 0,75; MP: 10033526-N3212LF; Link: https://www.digikey.com/en/products/detail/amphenol-cs-fci/10033526-N3212LF/4292074?s=N4IgTCBcDaIIwAYEGZkFYwDYC0A5ZYcYAMgGIgC6AvkA; ComponentLink1Description: CONN RCPT MINI USB B 5POS SMD RA; ComponentLink1URL: https://www.digikey.com/en/products/detail/amphenol-cs-fci/10033526-N3212LF/4292074?s=N4IgTCBcDaIIwAYEGZkFYwDYC0A5ZYcYAMgGIgC6AvkA; Value: 10033526-N3212LF
footprint AMPHENOL_10033526-N3212LF
pins: 1 VBUS (power), 2 D- (io), 3 D+ (io), 4 ID (io), 5 GND (power), SH1 SHIELD, SH2 SHIELD, SH3 SHIELD, SH4 SHIELD

## CONN_3_POS_1.25
designator J?, comment 609-5778-1-ND
Cabezal de conector Montaje en superficie, ángulo recto 3 posiciones 0.049" (1.25mm); MF: Molex; MP: 532610371; Check_prices: https://www.snapeda.com/parts/532610371/Molex/view-part/?ref=eda; Value: *; Price: None; Package: None; Availability: In Stock; Purchase-URL: https://pricing.snapeda.com/search/part/532610371/?ref=eda; SnapEDA_Link: https://www.snapeda.com/parts/532610371/Molex/view-part/?ref=snap; ComponentLink1Description: CONN HEADER SMD R/A 3POS 1.25MM; ComponentLink1URL: https://www.digikey.com/es/products/detail/amphenol-cs-fci/10114830-10103LF/4238857; Link: https://www.digikey.com/es/products/detail/amphenol-cs-fci/10114830-10103LF/4238857; Digi_Key_Part_Number: 609-5778-1-ND
footprint MOLEX_532610371
pins: 1, 2, 3, S1 SHIELD1, S2 SHIELD2

## CONN_6_POS_2MM
designator J?, comment 440055-6
Cabezal de conector Orificio pasante, ángulo recto 6 posiciones 0.079" (2.00mm); Digi_Key_Part_Number: A100047-ND; MF: {'manufacturer': 'TE Connectivity'}; Package: None; Availability: Unavailable; MP: 440055-6; Price: 0,29; ComponentLink1Description: CONN HEADER R/A 6POS 2MM; ComponentLink1URL: https://www.digikey.com/es/products/detail/te-connectivity-amp-connectors/440055-6/2077950; Link: https://www.digikey.com/es/products/detail/te-connectivity-amp-connectors/440055-6/2077950; Value: 440055-6
footprint TE_440055-6
pins: 1, 2, 3, 4, 5, 6

## CONN_6_POS_2MM_WITHOUT
designator J?, comment 440055-6
Cabezal de conector Orificio pasante, ángulo recto 6 posiciones 0.079" (2.00mm); Digi_Key_Part_Number: A100047-ND; MF: {'manufacturer': 'TE Connectivity'}; Package: None; Availability: Unavailable; MP: 440055-6; Price: 0,29; ComponentLink1Description: CONN HEADER R/A 6POS 2MM; ComponentLink1URL: https://www.digikey.com/es/products/detail/te-connectivity-amp-connectors/440055-6/2077950; Link: https://www.digikey.com/es/products/detail/te-connectivity-amp-connectors/440055-6/2077950; Value: 440055-6
footprint TE_440055-6WITHOUT
pins: 1, 2, 3, 4, 5, 6

## CONN_DF3A-6P-2MM
designator J?, comment DF3A-6P-2DS
Cabezal de conector Orificio pasante, ángulo recto 6 posiciones 0.079" (2.00mm); Mfr_Name: Hirose; Digi_Key_Part_Number: H3897-ND; RefDes: RefDes; Type: Type; ComponentLink1Description: CONN HEADER R/A 6POS 2MM; ComponentLink1URL: https://www.digikey.com/es/products/detail/hirose-electric-co-ltd/DF3A-6P-2DS/560463; Link: https://www.digikey.com/es/products/detail/hirose-electric-co-ltd/DF3A-6P-2DS/560463; Price: 0,33; Value: DF3A-6P-2DS
footprint CON6_1X6_R_DF3_HIR
pins: 1, 2, 3, 4, 5, 6

## CONN_ETHERNET _CETUS_J1B1211CCD
designator P?, comment 1278-1052-ND
1 Puerto RJ45Orificio pasante 10/100 Base-T, AutoMDIX; MF: Ceetus; MP: J1B1211CCD; Value: *; Package: None; Availability: Warning; Price: None; Supplier 1: Digi-Key; ComponentLink1Description: CONN JACK 1PORT 100 BASE-T PCB; ComponentLink1URL: 1 Puerto RJ45Orificio pasante 10/100 Base-T, AutoMDIX; Link: https://www.digikey.com/es/products/detail/J1B1211CCD/1278-1052-ND/7604176?utm_campaign=buynow&utm_medium=aggregator&curr=usd&utm_source=octopart; Digi-Key_Part_Number: 1278-1052-ND; Supplier Part Number 1: 1278-1052-ND
footprint J1B1211CCD
pins: 1 TPTX+, 2 AVCC2, 3 TPTX-, 4 TPRX+, 5 AVCC, 6 TPRX-, 8 Ground, 9 GRN-, 10 GRN+, 11 YLW-, 12 YLW+, 13 S1, 14 S2

## CONN_ETHERNET_ABRACON_ARJ11B -MBSAI-A-B EMU21742
designator P?, comment Supplier Part Number 1: ARJ11B-MESBQ-A-B-EMU2-ND  (hidden comment: 1278-1052-ND)
1 Puerto RJ45Orificio pasante 10/100 Base-T, AutoMDIX; MF: Abracon LLC; MP: ARJ11B-MBSAI-A-B-EMU2; Value: *; Package: None; Availability: Warning; Price: None; Supplier 1: Digi-Key; ComponentLink1Description: ARJ11B-MBSAI-A-B-EMU2; ComponentLink1URL: https://www.digikey.com/es/products/detail/abracon-llc/ARJ11B-MBSAI-A-B-EMU2/3059354; Link: https://www.digikey.com/es/products/detail/abracon-llc/ARJ11B-MBSAI-A-B-EMU2/3059354; Digi-Key_Part_Number: ARJ11B-MBSAI-A-B-EMU2-ND
footprint J1B1211CCD
pins: 1 TPTX+, 2 TPTX-, 3 AVCC, 4 GROUND, 6 AVCC2, 7 TPRX+, 8 TPRX-, 9 GRN+, 10 GRN-, 11 YLW+, 12 YLW-, 13 S1, 14 S2

## CONN_ETHERNET_ABRACON_ARJ11B-MESBQ-A-B-EMU2-ND
designator P?, comment Supplier Part Number 1: ARJ11B-MESBQ-A-B-EMU2-ND  (hidden comment: 1278-1052-ND)
1 Puerto RJ45Orificio pasante 10/100 Base-T, AutoMDIX; MF: Abracon LLC; MP: ARJ11B-MESBQ-A-B-EMU2; Value: *; Package: None; Availability: Warning; Price: None; ComponentLink1Description: ARJ11B-MESBQ-A-B-EMU2; ComponentLink1URL: https://www.digikey.com/es/products/detail/ARJ11B-MESBQ-A-B-EMU2/ARJ11B-MESBQ-A-B-EMU2-ND/3059340?utm_campaign=buynow&utm_medium=aggregator&curr=usd&utm_source=octopart; Digi-Key_Part_Number: ARJ11B-MESBQ-A-B-EMU2-ND; Link: https://www.digikey.com/es/products/detail/ARJ11B-MESBQ-A-B-EMU2/ARJ11B-MESBQ-A-B-EMU2-ND/3059340?utm_campaign=buynow&utm_medium=aggregator&curr=usd&utm_source=octopart
footprint J1B1211CCD
pins: 1 TPTX+, 2 AVCC, 3 TPTX-, 4 TPRX+, 4 GROUND, 5 AVCC2, 6 TPRX-, 9 GRN+, 10 GRN-, 11 YLW+, 12 YLW-, 13 S1, 14 S2

## CONN_ETHERNET_PULSEJACK_ J0011D01BNL
designator P?, comment Supplier Part Number 1: 553-1483-ND  (hidden comment: 1278-1052-ND)
1 Puerto RJ45Orificio pasante 10/100 Base-T, AutoMDIX; MF: Ceetus; MP: J1B1211CCD; Value: *; Package: None; Availability: Warning; SnapEDA_Link: https://www.snapeda.com/parts/J1B1211CCD/Cetus/view-part/561300/?ref=snap; Mouser-Purchase-URL: https://snapeda.com/shop?store=Mouser&id=561300; Price: None; Supplier 1: Digi-Key; Digi-Key_Part_Number: 553-1483-ND; Link: https://www.digikey.com/es/products/detail/pulse-electronics/j0011d01bnl/1036891; ComponentLink1Description: CONN JACK 1PORT 100 BASE-TX PCB J0011D01BNL; ComponentLink1URL: https://www.digikey.com/es/products/detail/pulse-electronics/j0011d01bnl/1036891
footprint J1B1211CCD
pins: 1 TPTX+, 2 TPTX-, 3 TPRX+, 4 AVCC, 5 AVCC2, 6 TPRX-, 8 GROUND, 9 GRN+, 10 GRN-, 11 YLW-, 12 YLW+, 13 S1, 14 S2

## CONN_JACK_AURICULAR
designator J?, comment SJ1-3515-SMT-TR
Auricular de 3.50mm (0.141", 1/8", mini clavija) Jack telefónico Estéreo (3 conductores, TRS) Conector Soldadura; Digi_Key_Part_Number: CP1-3515SJCT-ND; Link: https://www.digikey.com/es/products/detail/cui-devices/SJ1-3515-SMT-TR/659917; Package: None; CUI_purchase_URL: https://www.cuidevices.com/product/interconnect/connectors/audio-connectors/jacks/sj1-3515-smt-tr?utm_source=snapeda.com&utm_medium=referral&utm_campaign=snapedaBOM; MP: SJ1-3515-SMT-TR; Check_prices: https://www.snapeda.com/parts/SJ1-3515-SMT-TR/CUI+Devices/view-part/?ref=eda; ComponentLink1Description: CONN JACK STEREO 3.5MM SMD R/A; ComponentLink1URL: https://www.digikey.com/es/products/detail/cui-devices/SJ1-3515-SMT-TR/659917; Price: 1,21; Value: SJ1-3515-SMT-TR
footprint CUI_SJ1-3515-SMT-TR
pins: 1, 2, 3, 10, 11

## CONN_NPTC202KFMS-RC
designator J?, comment NPTC202KFMS-RC
40 Posiciones Cabecera Conector 0.100" (2.54mm) Montaje en superficie Estaño; Digi_Key_Part_Number: S5690-ND; Link: https://www.digikey.com/es/products/detail/sullins-connector-solutions/NPTC202KFMS-RC/776149; Price: 4,26; ComponentLink1Description: CONN HDR 40POS 0.1 TIN SMD; ComponentLink1URL: https://www.digikey.com/es/products/detail/sullins-connector-solutions/NPTC202KFMS-RC/776149; Value: NPTC202KFMS-RC
footprint SULLINS_NPTC202KFMS-RC
pins: 1, 2, 3, 4, 5, 6, 7, 8, 9, 10, 11, 12, 13, 14, 15, 16, 17, 18, 19, 20, 21, 22, 23, 24, 25, 26, 27, 28, 29, 30, 31, 32, 33, 34, 35, 36, 37, 38, 39, 40

## CONN_NPTC202KFMS-RC_RASP_BERRY
designator J?, comment NPTC202KFMS-RC
40 Posiciones Cabecera Conector 0.100" (2.54mm) Montaje en superficie Estaño; Digi_Key_Part_Number: S5690-ND; Link: https://www.digikey.com/es/products/detail/sullins-connector-solutions/NPTC202KFMS-RC/776149; Price: 4,26; ComponentLink1Description: CONN HDR 40POS 0.1 TIN SMD; ComponentLink1URL: https://www.digikey.com/es/products/detail/sullins-connector-solutions/NPTC202KFMS-RC/776149; Price JLCPCB: 0,49; LCSC Part: C22436166; Value: NPTC202KFMS-RC
footprint SULLINS_NPTC202KFMS-RC
pins: 1 +3V3 (power), 2 +5V (power), 3 GPIO2 (I2C SDA) (io), 4 +5V (power), 5 GPIO3 (I2C SCL) (io), 6 GND (power), 7 GPIO4 (io), 8 UART0 TX (io), 9 GND (power), 10 UART0 RX (io), 11 GPIO17 (io), 12 GPIO18 (io), 13 GPIO27 (io), 14 GND (power), 15 GPIO22 (io), 16 GPIO23 (io), 17 +3V3 (power), 18 GPIO24 (io), 19 GPIO10 (SPI0 MOSI) (io), 20 GND (power), 21 GPIO9 (SPI0 MISO) (io), 22 GPIO25 (io), 23 GPIO11 (SPI0 SCLK) (io), 24 GPIO8 (SPI0 CS0) (io), 25 GND (power), 26 GPIO7 (SPI0 CS1) (io), 27 RSVD, 28 RSVD, 29 GPIO5 (io), 30 GND (power), 31 GPIO6 (io), 32 GPIO12 (io), 33 GPIO13 (io), 34 GND, 35 GPIO19 (SPI1 MISO) (io), 36 GPIO16 (SPI1 CS0) (io), 37 GPIO26 (io), 38 GPIO20 (SPI1 MOSI) (io), 39 GND (power), 40 GPIO21 (SPI1 SCLK) (io)

## CONN_PWR_JACK_2.1X5.5MM
designator J?, comment EJ508A
Power Barrel Connector Jack 2.10mm ID _0.083_, 5.50mm OD _0.217_ Through Hole, Right Angle; Digi_Key_Part_Number: EJ508A-ND; MF: MPD; Package: Non-Standard MPD; SnapEDA_Link: https://www.snapeda.com/parts/EJ508A/MPD%20%28Memory%20Protection%20Devices%29/view-part/474399/?ref=snap; Price: None; MP: EJ508A; Availability: Unavailable; ComponentLink1Description: EJ508A; ComponentLink1URL: https://www.digikey.com/es/products/detail/mpd-memory-protection-devices/EJ508A/2439547; Link: https://www.digikey.com/es/products/detail/mpd-memory-protection-devices/EJ508A/2439547; Value: EJ508A
footprint MPD_EJ508A
pins: 1, 2, 3

## CONN_PWR_JACK_2.5X5.5MM
designator J?, comment PJ-102B
Cilindro - Conectores de potencia Jack 2.50mm DI (0.098"), 5.50mm DE (0.217") Orificio pasante, ángulo recto; Manufacturer_Name: CUI Devices; Manufacturer_Part_Number: PJ-102BH; Digi_Key_Part_Number: CP-102B-ND; Datasheet Link: https://componentsearchengine.com/Datasheets/1/PJ-102BH.pdf; Mouser Part Number: 490-PJ-102BH; Mouser Price/Stock: https://www.mouser.co.uk/ProductDetail/CUI-Devices/PJ-102BH?qs=WyjlAZoYn51LQvDYqCqBtA%3D%3D; Arrow Part Number: PJ-102BH; Arrow Price/Stock: https://www.arrow.com/en/products/pj-102bh/cui-devices?region=nac; ComponentLink1Description: PJ-102B; ComponentLink1URL: https://www.digikey.com/es/products/detail/cui-devices/PJ-102B/281307; Link: https://www.digikey.com/es/products/detail/cui-devices/PJ-102B/281307; Value: PJ-102B
footprint PJ-102AH
pins: 1, 2, 3
